# Altium schematic symbol library jlcpcb_2025_04_capacitors_extended_0805.schlib: 3281 symbols (part 7 of 18) (continued)
## C2012X7R2E222KT020U
designator C?  Capacitance: 2.2nF  (hidden comment: *)
Capacitor, Ceramic (MLCC), 2.2nF, ±10%, 250V, X7R, ±10%, SMD 0805; Manufacturer: TDK; Manufacturer Part Number: C2012X7R2E222KT020U; Package Size: 0805; JLCPCB Basic Part: No; JLCPCB Part Number: C343005; Supplier 1: LCSC; Category: Capacitors - MLCC; Supplier Part Number 1: C343005; Tolerance: ±10%; Voltage Rating: 250V; Temperature Coefficient: X7R; RoHS: Yes; ComponentLink1Description: Datasheet; ComponentLink1URL: https://wmsc.lcsc.com/wmsc/upload/file/pdf/v2/lcsc/2304140030_TDK-C2012X7R2E222KT020U_C343005.pdf; ComponentLink2Description: JLCPCB Part URL; ComponentLink2URL: https://jlcpcb.com/partdetail/C343005; ComponentLink3Description: LCSC Part URL; ComponentLink3URL: https://lcsc.com/product-detail/Multilayer-Ceramic-Capacitors-MLCC---SMD-SMT_TDK-TDK-C2012X7R2E222KT020U_C343005.html
footprint CAP-0805 (0805 (2012M) Capacitor)
pins: 1, 2

## C2012X7R2E223KT0L0U
designator C?  Capacitance: 22nF  (hidden comment: *)
Capacitor, Ceramic (MLCC), 22nF, ±10%, 250V, X7R, ±10%, SMD 0805; Manufacturer: TDK; Manufacturer Part Number: C2012X7R2E223KT0L0U; Package Size: 0805; JLCPCB Basic Part: No; JLCPCB Part Number: C342474; Supplier 1: LCSC; Category: Capacitors - MLCC; Supplier Part Number 1: C342474; Tolerance: ±10%; Voltage Rating: 250V; Temperature Coefficient: X7R; RoHS: Yes; ComponentLink1Description: Datasheet; ComponentLink1URL: https://wmsc.lcsc.com/wmsc/upload/file/pdf/v2/lcsc/2304140030_TDK-C2012X7R2E223KT0L0U_C342474.pdf; ComponentLink2Description: JLCPCB Part URL; ComponentLink2URL: https://jlcpcb.com/partdetail/C342474; ComponentLink3Description: LCSC Part URL; ComponentLink3URL: https://lcsc.com/product-detail/Multilayer-Ceramic-Capacitors-MLCC---SMD-SMT_TDK-TDK-C2012X7R2E223KT0L0U_C342474.html
footprint CAP-0805 (0805 (2012M) Capacitor)
pins: 1, 2

## C2012X7R102KGTS
designator C?  Capacitance: 1nF  (hidden comment: *)
Capacitor, Ceramic (MLCC), 1nF, ±10%, 50V, X7R, ±10%, SMD 0805; Manufacturer: Darfon Elec; Manufacturer Part Number: C2012X7R102KGTS; Package Size: 0805; JLCPCB Basic Part: No; JLCPCB Part Number: C722241; Supplier 1: LCSC; Category: Capacitors - MLCC; Supplier Part Number 1: C722241; Tolerance: ±10%; Voltage Rating: 50V; Temperature Coefficient: X7R; RoHS: Yes; ComponentLink1Description: Datasheet; ComponentLink1URL: https://wmsc.lcsc.com/wmsc/upload/file/pdf/v2/lcsc/2008181235_Darfon-Elec-C2012X7R102KGTS_C722241.pdf; ComponentLink2Description: JLCPCB Part URL; ComponentLink2URL: https://jlcpcb.com/partdetail/C722241; ComponentLink3Description: LCSC Part URL; ComponentLink3URL: https://lcsc.com/product-detail/Multilayer-Ceramic-Capacitors-MLCC---SMD-SMT_Darfon-Elec-Darfon-Elec-C2012X7R102KGTS_C722241.html
footprint CAP-0805 (0805 (2012M) Capacitor)
pins: 1, 2

## C2012X7R103KGTS
designator C?  Capacitance: 10nF  (hidden comment: *)
Capacitor, Ceramic (MLCC), 10nF, ±10%, 50V, X7R, ±10%, SMD 0805; Manufacturer: Darfon Elec; Manufacturer Part Number: C2012X7R103KGTS; Package Size: 0805; JLCPCB Basic Part: No; JLCPCB Part Number: C722238; Supplier 1: LCSC; Category: Capacitors - MLCC; Supplier Part Number 1: C722238; Tolerance: ±10%; Voltage Rating: 50V; Temperature Coefficient: X7R; RoHS: Yes; ComponentLink1Description: Datasheet; ComponentLink1URL: https://wmsc.lcsc.com/wmsc/upload/file/pdf/v2/lcsc/2304140030_Darfon-Elec-C2012X7R103KGTS_C722238.pdf; ComponentLink2Description: JLCPCB Part URL; ComponentLink2URL: https://jlcpcb.com/partdetail/C722238; ComponentLink3Description: LCSC Part URL; ComponentLink3URL: https://lcsc.com/product-detail/Multilayer-Ceramic-Capacitors-MLCC---SMD-SMT_Darfon-Elec-Darfon-Elec-C2012X7R103KGTS_C722238.html
footprint CAP-0805 (0805 (2012M) Capacitor)
pins: 1, 2

## C2012X7R153KHTS
designator C?  Capacitance: 15nF  (hidden comment: *)
Capacitor, Ceramic (MLCC), 15nF, ±10%, 100V, X7R, ±10%, SMD 0805; Manufacturer: Darfon Elec; Manufacturer Part Number: C2012X7R153KHTS; Package Size: 0805; JLCPCB Basic Part: No; JLCPCB Part Number: C725585; Supplier 1: LCSC; Category: Capacitors - MLCC; Supplier Part Number 1: C725585; Tolerance: ±10%; Voltage Rating: 100V; Temperature Coefficient: X7R; RoHS: Yes; ComponentLink1Description: Datasheet; ComponentLink1URL: https://wmsc.lcsc.com/wmsc/upload/file/pdf/v2/lcsc/2304140030_Darfon-Elec-C2012X7R153KHTS_C725585.pdf; ComponentLink2Description: JLCPCB Part URL; ComponentLink2URL: https://jlcpcb.com/partdetail/C725585; ComponentLink3Description: LCSC Part URL; ComponentLink3URL: https://lcsc.com/product-detail/Multilayer-Ceramic-Capacitors-MLCC---SMD-SMT_Darfon-Elec-Darfon-Elec-C2012X7R153KHTS_C725585.html
footprint CAP-0805 (0805 (2012M) Capacitor)
pins: 1, 2

## C2012X7R224KGTS
designator C?  Capacitance: 220nF  (hidden comment: *)
Capacitor, Ceramic (MLCC), 220nF, ±10%, 50V, X7R, ±10%, SMD 0805; Manufacturer: Darfon Elec; Manufacturer Part Number: C2012X7R224KGTS; Package Size: 0805; JLCPCB Basic Part: No; JLCPCB Part Number: C725579; Supplier 1: LCSC; Category: Capacitors - MLCC; Supplier Part Number 1: C725579; Tolerance: ±10%; Voltage Rating: 50V; Temperature Coefficient: X7R; RoHS: Yes; ComponentLink1Description: Datasheet; ComponentLink1URL: https://wmsc.lcsc.com/wmsc/upload/file/pdf/v2/lcsc/2304140030_Darfon-Elec-C2012X7R224KGTS_C725579.pdf; ComponentLink2Description: JLCPCB Part URL; ComponentLink2URL: https://jlcpcb.com/partdetail/C725579; ComponentLink3Description: LCSC Part URL; ComponentLink3URL: https://lcsc.com/product-detail/Multilayer-Ceramic-Capacitors-MLCC---SMD-SMT_Darfon-Elec-Darfon-Elec-C2012X7R224KGTS_C725579.html
footprint CAP-0805 (0805 (2012M) Capacitor)
pins: 1, 2

## C2012X7R471KKTS
designator C?  Capacitance: 470pF  (hidden comment: *)
Capacitor, Ceramic (MLCC), 470pF, ±10%, 250V, X7R, ±10%, SMD 0805; Manufacturer: Darfon Elec; Manufacturer Part Number: C2012X7R471KKTS; Package Size: 0805; JLCPCB Basic Part: No; JLCPCB Part Number: C725588; Supplier 1: LCSC; Category: Capacitors - MLCC; Supplier Part Number 1: C725588; Tolerance: ±10%; Voltage Rating: 250V; Temperature Coefficient: X7R; RoHS: Yes; ComponentLink1Description: Datasheet; ComponentLink1URL: https://wmsc.lcsc.com/wmsc/upload/file/pdf/v2/lcsc/2304140030_Darfon-Elec-C2012X7R471KKTS_C725588.pdf; ComponentLink2Description: JLCPCB Part URL; ComponentLink2URL: https://jlcpcb.com/partdetail/C725588; ComponentLink3Description: LCSC Part URL; ComponentLink3URL: https://lcsc.com/product-detail/Multilayer-Ceramic-Capacitors-MLCC---SMD-SMT_Darfon-Elec-Darfon-Elec-C2012X7R471KKTS_C725588.html
footprint CAP-0805 (0805 (2012M) Capacitor)
pins: 1, 2

## C2012X7S0J226MT000E
designator C?  Capacitance: 22uF  (hidden comment: *)
Capacitor, Ceramic (MLCC), 22uF, ±20%, 6.3V, X7S, ±20%, SMD 0805; Manufacturer: TDK; Manufacturer Part Number: C2012X7S0J226MT000E; Package Size: 0805; JLCPCB Basic Part: No; JLCPCB Part Number: C342680; Supplier 1: LCSC; Category: Capacitors - MLCC; Supplier Part Number 1: C342680; Tolerance: ±20%; Voltage Rating: 6.3V; Temperature Coefficient: X7S; RoHS: Yes; ComponentLink1Description: Datasheet; ComponentLink1URL: https://wmsc.lcsc.com/wmsc/upload/file/pdf/v2/lcsc/2304140030_TDK-C2012X7S0J226MT000E_C342680.pdf; ComponentLink2Description: JLCPCB Part URL; ComponentLink2URL: https://jlcpcb.com/partdetail/C342680; ComponentLink3Description: LCSC Part URL; ComponentLink3URL: https://lcsc.com/product-detail/Multilayer-Ceramic-Capacitors-MLCC---SMD-SMT_TDK-TDK-C2012X7S0J226MT000E_C342680.html
footprint CAP-0805 (0805 (2012M) Capacitor)
pins: 1, 2

## C2012X7S1A226MT000E
designator C?  Capacitance: 22uF  (hidden comment: *)
Capacitor, Ceramic (MLCC), 22uF, ±20%, 10V, X7S, ±20%, SMD 0805; Manufacturer: TDK; Manufacturer Part Number: C2012X7S1A226MT000E; Package Size: 0805; JLCPCB Basic Part: No; JLCPCB Part Number: C342717; Supplier 1: LCSC; Category: Capacitors - MLCC; Supplier Part Number 1: C342717; Tolerance: ±20%; Voltage Rating: 10V; Temperature Coefficient: X7S; RoHS: Yes; ComponentLink1Description: Datasheet; ComponentLink1URL: https://wmsc.lcsc.com/wmsc/upload/file/pdf/v2/lcsc/2304140030_TDK-C2012X7S1A226MT000E_C342717.pdf; ComponentLink2Description: JLCPCB Part URL; ComponentLink2URL: https://jlcpcb.com/partdetail/C342717; ComponentLink3Description: LCSC Part URL; ComponentLink3URL: https://lcsc.com/product-detail/Multilayer-Ceramic-Capacitors-MLCC---SMD-SMT_TDK-TDK-C2012X7S1A226MT000E_C342717.html
footprint CAP-0805 (0805 (2012M) Capacitor)
pins: 1, 2

## C2012X7S1E106K125AE
designator C?  Capacitance: 10uF  (hidden comment: *)
Capacitor, Ceramic (MLCC), 10uF, 25V, X7S, SMD 0805; Manufacturer: TDK; Manufacturer Part Number: C2012X7S1E106K125AE; Package Size: 0805; JLCPCB Basic Part: No; JLCPCB Part Number: C3901911; Supplier 1: LCSC; Category: Capacitors - MLCC; Supplier Part Number 1: C3901911; Voltage Rating: 25V; Temperature Coefficient: X7S; RoHS: Yes; ComponentLink1Description: Datasheet; ComponentLink1URL: https://wmsc.lcsc.com/wmsc/upload/file/pdf/v2/lcsc/2401221636_TDK-C2012X7S1E106K125AE_C3901911.pdf; ComponentLink2Description: JLCPCB Part URL; ComponentLink2URL: https://jlcpcb.com/partdetail/C3901911; ComponentLink3Description: LCSC Part URL; ComponentLink3URL: https://lcsc.com/product-detail/Multilayer-Ceramic-Capacitors-MLCC---SMD-SMT_TDK-TDK-C2012X7S1E106K125AE_C3901911.html
footprint CAP-0805 (0805 (2012M) Capacitor)
pins: 1, 2

## C2012X7S1E106KT0A0E
designator C?  Capacitance: 10uF  (hidden comment: *)
Capacitor, Ceramic (MLCC), 10uF, ±10%, 25V, ±10%, SMD 0805; Manufacturer: TDK; Manufacturer Part Number: C2012X7S1E106KT0A0E; Package Size: 0805; JLCPCB Basic Part: No; JLCPCB Part Number: C694191; Supplier 1: LCSC; Category: Capacitors - MLCC; Supplier Part Number 1: C694191; Tolerance: ±10%; Voltage Rating: 25V; RoHS: Yes; ComponentLink1Description: Datasheet; ComponentLink1URL: https://wmsc.lcsc.com/wmsc/upload/file/pdf/v2/lcsc/2304140030_TDK-C2012X7S1E106KT0A0E_C694191.pdf; ComponentLink2Description: JLCPCB Part URL; ComponentLink2URL: https://jlcpcb.com/partdetail/C694191; ComponentLink3Description: LCSC Part URL; ComponentLink3URL: https://lcsc.com/product-detail/Multilayer-Ceramic-Capacitors-MLCC---SMD-SMT_TDK-TDK-C2012X7S1E106KT0A0E_C694191.html
footprint CAP-0805 (0805 (2012M) Capacitor)
pins: 1, 2

## C2012X7S2A105KT000N
designator C?  Capacitance: 1uF  (hidden comment: *)
Capacitor, Ceramic (MLCC), 1uF, ±10%, 100V, X7S, ±10%, SMD 0805; Manufacturer: TDK; Manufacturer Part Number: C2012X7S2A105KT000N; Package Size: 0805; JLCPCB Basic Part: No; JLCPCB Part Number: C342785; Supplier 1: LCSC; Category: Capacitors - MLCC; Supplier Part Number 1: C342785; Tolerance: ±10%; Voltage Rating: 100V; Temperature Coefficient: X7S; RoHS: Yes; ComponentLink1Description: Datasheet; ComponentLink1URL: https://wmsc.lcsc.com/wmsc/upload/file/pdf/v2/lcsc/2304140030_TDK-C2012X7S2A105KT000N_C342785.pdf; ComponentLink2Description: JLCPCB Part URL; ComponentLink2URL: https://jlcpcb.com/partdetail/C342785; ComponentLink3Description: LCSC Part URL; ComponentLink3URL: https://lcsc.com/product-detail/Multilayer-Ceramic-Capacitors-MLCC---SMD-SMT_TDK-TDK-C2012X7S2A105KT000N_C342785.html
footprint CAP-0805 (0805 (2012M) Capacitor)
pins: 1, 2

## C2012X7S2A224KT000N
designator C?  Capacitance: 220nF  (hidden comment: *)
Capacitor, Ceramic (MLCC), 220nF, ±10%, 100V, X7S, ±10%, SMD 0805; Manufacturer: TDK; Manufacturer Part Number: C2012X7S2A224KT000N; Package Size: 0805; JLCPCB Basic Part: No; JLCPCB Part Number: C342873; Supplier 1: LCSC; Category: Capacitors - MLCC; Supplier Part Number 1: C342873; Tolerance: ±10%; Voltage Rating: 100V; Temperature Coefficient: X7S; RoHS: Yes; ComponentLink1Description: Datasheet; ComponentLink1URL: https://wmsc.lcsc.com/wmsc/upload/file/pdf/v2/lcsc/2304140030_TDK-C2012X7S2A224KT000N_C342873.pdf; ComponentLink2Description: JLCPCB Part URL; ComponentLink2URL: https://jlcpcb.com/partdetail/C342873; ComponentLink3Description: LCSC Part URL; ComponentLink3URL: https://lcsc.com/product-detail/Multilayer-Ceramic-Capacitors-MLCC---SMD-SMT_TDK-TDK-C2012X7S2A224KT000N_C342873.html
footprint CAP-0805 (0805 (2012M) Capacitor)
pins: 1, 2

## C2012X7S2A474KT000N
designator C?  Capacitance: 470nF  (hidden comment: *)
Capacitor, Ceramic (MLCC), 470nF, ±10%, 100V, X7S, ±10%, SMD 0805; Manufacturer: TDK; Manufacturer Part Number: C2012X7S2A474KT000N; Package Size: 0805; JLCPCB Basic Part: No; JLCPCB Part Number: C342818; Supplier 1: LCSC; Category: Capacitors - MLCC; Supplier Part Number 1: C342818; Tolerance: ±10%; Voltage Rating: 100V; Temperature Coefficient: X7S; RoHS: Yes; ComponentLink1Description: Datasheet; ComponentLink1URL: https://wmsc.lcsc.com/wmsc/upload/file/pdf/v2/lcsc/2304140030_TDK-C2012X7S2A474KT000N_C342818.pdf; ComponentLink2Description: JLCPCB Part URL; ComponentLink2URL: https://jlcpcb.com/partdetail/C342818; ComponentLink3Description: LCSC Part URL; ComponentLink3URL: https://lcsc.com/product-detail/Multilayer-Ceramic-Capacitors-MLCC---SMD-SMT_TDK-TDK-C2012X7S2A474KT000N_C342818.html
footprint CAP-0805 (0805 (2012M) Capacitor)
pins: 1, 2

## C2012X7T2E104KT000N
designator C?  Capacitance: 100nF  (hidden comment: *)
Capacitor, Ceramic (MLCC), 100nF, ±10%, 250V, X7T, ±10%, SMD 0805; Manufacturer: TDK; Manufacturer Part Number: C2012X7T2E104KT000N; Package Size: 0805; JLCPCB Basic Part: No; JLCPCB Part Number: C342865; Supplier 1: LCSC; Category: Capacitors - MLCC; Supplier Part Number 1: C342865; Tolerance: ±10%; Voltage Rating: 250V; Temperature Coefficient: X7T; RoHS: Yes; ComponentLink1Description: Datasheet; ComponentLink1URL: https://wmsc.lcsc.com/wmsc/upload/file/pdf/v2/lcsc/2304140030_TDK-C2012X7T2E104KT000N_C342865.pdf; ComponentLink2Description: JLCPCB Part URL; ComponentLink2URL: https://jlcpcb.com/partdetail/C342865; ComponentLink3Description: LCSC Part URL; ComponentLink3URL: https://lcsc.com/product-detail/Multilayer-Ceramic-Capacitors-MLCC---SMD-SMT_TDK-TDK-C2012X7T2E104KT000N_C342865.html
footprint CAP-0805 (0805 (2012M) Capacitor)
pins: 1, 2

## C2012X7T2E473KT000N
designator C?  Capacitance: 47nF  (hidden comment: *)
Capacitor, Ceramic (MLCC), 47nF, ±10%, 250V, X7T, ±10%, SMD 0805; Manufacturer: TDK; Manufacturer Part Number: C2012X7T2E473KT000N; Package Size: 0805; JLCPCB Basic Part: No; JLCPCB Part Number: C338058; Supplier 1: LCSC; Category: Capacitors - MLCC; Supplier Part Number 1: C338058; Tolerance: ±10%; Voltage Rating: 250V; Temperature Coefficient: X7T; RoHS: Yes; ComponentLink1Description: Datasheet; ComponentLink1URL: https://wmsc.lcsc.com/wmsc/upload/file/pdf/v2/lcsc/2304140030_TDK-C2012X7T2E473KT000N_C338058.pdf; ComponentLink2Description: JLCPCB Part URL; ComponentLink2URL: https://jlcpcb.com/partdetail/C338058; ComponentLink3Description: LCSC Part URL; ComponentLink3URL: https://lcsc.com/product-detail/Multilayer-Ceramic-Capacitors-MLCC---SMD-SMT_TDK-TDK-C2012X7T2E473KT000N_C338058.html
footprint CAP-0805 (0805 (2012M) Capacitor)
pins: 1, 2

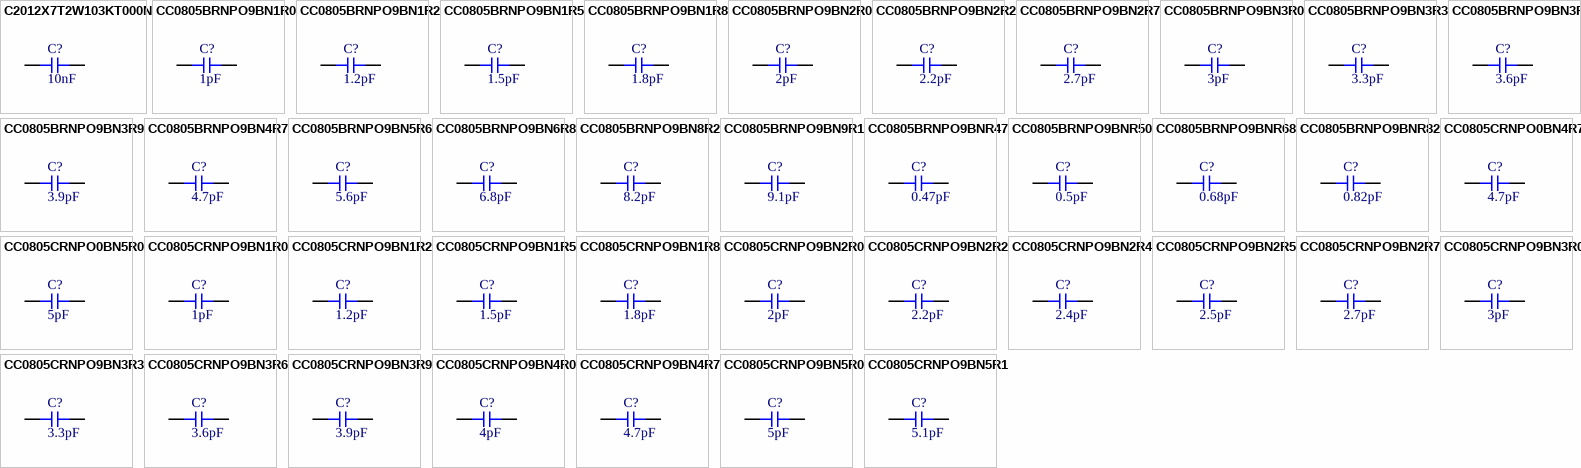
[diagram p30: symbols C2012X7T2W103KT000N to CC0805CRNPO9BN5R1]

## C2012X7T2W103KT000N
designator C?  Capacitance: 10nF  (hidden comment: *)
Capacitor, Ceramic (MLCC), 10nF, ±10%, 450V, X7T, ±10%, SMD 0805; Manufacturer: TDK; Manufacturer Part Number: C2012X7T2W103KT000N; Package Size: 0805; JLCPCB Basic Part: No; JLCPCB Part Number: C342860; Supplier 1: LCSC; Category: Capacitors - MLCC; Supplier Part Number 1: C342860; Tolerance: ±10%; Voltage Rating: 450V; Temperature Coefficient: X7T; RoHS: Yes; ComponentLink1Description: Datasheet; ComponentLink1URL: https://wmsc.lcsc.com/wmsc/upload/file/pdf/v2/lcsc/2304140030_TDK-C2012X7T2W103KT000N_C342860.pdf; ComponentLink2Description: JLCPCB Part URL; ComponentLink2URL: https://jlcpcb.com/partdetail/C342860; ComponentLink3Description: LCSC Part URL; ComponentLink3URL: https://lcsc.com/product-detail/Multilayer-Ceramic-Capacitors-MLCC---SMD-SMT_TDK-TDK-C2012X7T2W103KT000N_C342860.html
footprint CAP-0805 (0805 (2012M) Capacitor)
pins: 1, 2

## CC0805BRNPO9BN1R0
designator C?  Capacitance: 1pF  (hidden comment: *)
Capacitor, Ceramic (MLCC), 1pF, 50V, NP0, SMD 0805; Manufacturer: YAGEO; Manufacturer Part Number: CC0805BRNPO9BN1R0; Package Size: 0805; JLCPCB Basic Part: No; JLCPCB Part Number: C519982; Supplier 1: LCSC; Category: Capacitors - MLCC; Supplier Part Number 1: C519982; Voltage Rating: 50V; Temperature Coefficient: NP0; RoHS: Yes; ComponentLink1Description: Datasheet; ComponentLink1URL: https://wmsc.lcsc.com/wmsc/upload/file/pdf/v2/lcsc/2005141203_YAGEO-CC0805BRNPO9BN1R0_C519982.pdf; ComponentLink2Description: JLCPCB Part URL; ComponentLink2URL: https://jlcpcb.com/partdetail/C519982; ComponentLink3Description: LCSC Part URL; ComponentLink3URL: https://lcsc.com/product-detail/Multilayer-Ceramic-Capacitors-MLCC---SMD-SMT_YAGEO-YAGEO-CC0805BRNPO9BN1R0_C519982.html
footprint CAP-0805 (0805 (2012M) Capacitor)
pins: 1, 2

## CC0805BRNPO9BN1R2
designator C?  Capacitance: 1.2pF  (hidden comment: *)
Capacitor, Ceramic (MLCC), 1.2pF, 50V, NP0, SMD 0805; Manufacturer: YAGEO; Manufacturer Part Number: CC0805BRNPO9BN1R2; Package Size: 0805; JLCPCB Basic Part: No; JLCPCB Part Number: C519983; Supplier 1: LCSC; Category: Capacitors - MLCC; Supplier Part Number 1: C519983; Voltage Rating: 50V; Temperature Coefficient: NP0; RoHS: Yes; ComponentLink1Description: Datasheet; ComponentLink1URL: https://wmsc.lcsc.com/wmsc/upload/file/pdf/v2/lcsc/2008122133_YAGEO-CC0805BRNPO9BN1R2_C519983.pdf; ComponentLink2Description: JLCPCB Part URL; ComponentLink2URL: https://jlcpcb.com/partdetail/C519983; ComponentLink3Description: LCSC Part URL; ComponentLink3URL: https://lcsc.com/product-detail/Multilayer-Ceramic-Capacitors-MLCC---SMD-SMT_YAGEO-YAGEO-CC0805BRNPO9BN1R2_C519983.html
footprint CAP-0805 (0805 (2012M) Capacitor)
pins: 1, 2

## CC0805BRNPO9BN1R5
designator C?  Capacitance: 1.5pF  (hidden comment: *)
Capacitor, Ceramic (MLCC), 1.5pF, 50V, NP0, SMD 0805; Manufacturer: YAGEO; Manufacturer Part Number: CC0805BRNPO9BN1R5; Package Size: 0805; JLCPCB Basic Part: No; JLCPCB Part Number: C519984; Supplier 1: LCSC; Category: Capacitors - MLCC; Supplier Part Number 1: C519984; Voltage Rating: 50V; Temperature Coefficient: NP0; RoHS: Yes; ComponentLink1Description: Datasheet; ComponentLink1URL: https://wmsc.lcsc.com/wmsc/upload/file/pdf/v2/lcsc/2007161235_YAGEO-CC0805BRNPO9BN1R5_C519984.pdf; ComponentLink2Description: JLCPCB Part URL; ComponentLink2URL: https://jlcpcb.com/partdetail/C519984; ComponentLink3Description: LCSC Part URL; ComponentLink3URL: https://lcsc.com/product-detail/Multilayer-Ceramic-Capacitors-MLCC---SMD-SMT_YAGEO-YAGEO-CC0805BRNPO9BN1R5_C519984.html
footprint CAP-0805 (0805 (2012M) Capacitor)
pins: 1, 2

## CC0805BRNPO9BN1R8
designator C?  Capacitance: 1.8pF  (hidden comment: *)
Capacitor, Ceramic (MLCC), 1.8pF, 50V, NP0, SMD 0805; Manufacturer: YAGEO; Manufacturer Part Number: CC0805BRNPO9BN1R8; Package Size: 0805; JLCPCB Basic Part: No; JLCPCB Part Number: C519985; Supplier 1: LCSC; Category: Capacitors - MLCC; Supplier Part Number 1: C519985; Voltage Rating: 50V; Temperature Coefficient: NP0; RoHS: Yes; ComponentLink1Description: Datasheet; ComponentLink1URL: https://wmsc.lcsc.com/wmsc/upload/file/pdf/v2/lcsc/2007161235_YAGEO-CC0805BRNPO9BN1R8_C519985.pdf; ComponentLink2Description: JLCPCB Part URL; ComponentLink2URL: https://jlcpcb.com/partdetail/C519985; ComponentLink3Description: LCSC Part URL; ComponentLink3URL: https://lcsc.com/product-detail/Multilayer-Ceramic-Capacitors-MLCC---SMD-SMT_YAGEO-YAGEO-CC0805BRNPO9BN1R8_C519985.html
footprint CAP-0805 (0805 (2012M) Capacitor)
pins: 1, 2

## CC0805BRNPO9BN2R0
designator C?  Capacitance: 2pF  (hidden comment: *)
Capacitor, Ceramic (MLCC), 2pF, 50V, NP0, SMD 0805; Manufacturer: YAGEO; Manufacturer Part Number: CC0805BRNPO9BN2R0; Package Size: 0805; JLCPCB Basic Part: No; JLCPCB Part Number: C519986; Supplier 1: LCSC; Category: Capacitors - MLCC; Supplier Part Number 1: C519986; Voltage Rating: 50V; Temperature Coefficient: NP0; RoHS: Yes; ComponentLink1Description: Datasheet; ComponentLink1URL: https://wmsc.lcsc.com/wmsc/upload/file/pdf/v2/lcsc/2006011836_YAGEO-CC0805BRNPO9BN2R0_C519986.pdf; ComponentLink2Description: JLCPCB Part URL; ComponentLink2URL: https://jlcpcb.com/partdetail/C519986; ComponentLink3Description: LCSC Part URL; ComponentLink3URL: https://lcsc.com/product-detail/Multilayer-Ceramic-Capacitors-MLCC---SMD-SMT_YAGEO-YAGEO-CC0805BRNPO9BN2R0_C519986.html
footprint CAP-0805 (0805 (2012M) Capacitor)
pins: 1, 2

## CC0805BRNPO9BN2R2
designator C?  Capacitance: 2.2pF  (hidden comment: *)
Capacitor, Ceramic (MLCC), 2.2pF, 50V, NP0, SMD 0805; Manufacturer: YAGEO; Manufacturer Part Number: CC0805BRNPO9BN2R2; Package Size: 0805; JLCPCB Basic Part: No; JLCPCB Part Number: C519987; Supplier 1: LCSC; Category: Capacitors - MLCC; Supplier Part Number 1: C519987; Voltage Rating: 50V; Temperature Coefficient: NP0; RoHS: Yes; ComponentLink1Description: Datasheet; ComponentLink1URL: https://wmsc.lcsc.com/wmsc/upload/file/pdf/v2/lcsc/2006011836_YAGEO-CC0805BRNPO9BN2R2_C519987.pdf; ComponentLink2Description: JLCPCB Part URL; ComponentLink2URL: https://jlcpcb.com/partdetail/C519987; ComponentLink3Description: LCSC Part URL; ComponentLink3URL: https://lcsc.com/product-detail/Multilayer-Ceramic-Capacitors-MLCC---SMD-SMT_YAGEO-YAGEO-CC0805BRNPO9BN2R2_C519987.html
footprint CAP-0805 (0805 (2012M) Capacitor)
pins: 1, 2

## CC0805BRNPO9BN2R7
designator C?  Capacitance: 2.7pF  (hidden comment: *)
Capacitor, Ceramic (MLCC), 2.7pF, 50V, NP0, SMD 0805; Manufacturer: YAGEO; Manufacturer Part Number: CC0805BRNPO9BN2R7; Package Size: 0805; JLCPCB Basic Part: No; JLCPCB Part Number: C519988; Supplier 1: LCSC; Category: Capacitors - MLCC; Supplier Part Number 1: C519988; Voltage Rating: 50V; Temperature Coefficient: NP0; RoHS: Yes; ComponentLink1Description: Datasheet; ComponentLink1URL: https://wmsc.lcsc.com/wmsc/upload/file/pdf/v2/lcsc/2007161235_YAGEO-CC0805BRNPO9BN2R7_C519988.pdf; ComponentLink2Description: JLCPCB Part URL; ComponentLink2URL: https://jlcpcb.com/partdetail/C519988; ComponentLink3Description: LCSC Part URL; ComponentLink3URL: https://lcsc.com/product-detail/Multilayer-Ceramic-Capacitors-MLCC---SMD-SMT_YAGEO-YAGEO-CC0805BRNPO9BN2R7_C519988.html
footprint CAP-0805 (0805 (2012M) Capacitor)
pins: 1, 2

## CC0805BRNPO9BN3R0
designator C?  Capacitance: 3pF  (hidden comment: *)
Capacitor, Ceramic (MLCC), 3pF, 50V, NP0, SMD 0805; Manufacturer: YAGEO; Manufacturer Part Number: CC0805BRNPO9BN3R0; Package Size: 0805; JLCPCB Basic Part: No; JLCPCB Part Number: C519989; Supplier 1: LCSC; Category: Capacitors - MLCC; Supplier Part Number 1: C519989; Voltage Rating: 50V; Temperature Coefficient: NP0; RoHS: Yes; ComponentLink1Description: Datasheet; ComponentLink1URL: https://wmsc.lcsc.com/wmsc/upload/file/pdf/v2/lcsc/2007161235_YAGEO-CC0805BRNPO9BN3R0_C519989.pdf; ComponentLink2Description: JLCPCB Part URL; ComponentLink2URL: https://jlcpcb.com/partdetail/C519989; ComponentLink3Description: LCSC Part URL; ComponentLink3URL: https://lcsc.com/product-detail/Multilayer-Ceramic-Capacitors-MLCC---SMD-SMT_YAGEO-YAGEO-CC0805BRNPO9BN3R0_C519989.html
footprint CAP-0805 (0805 (2012M) Capacitor)
pins: 1, 2

## CC0805BRNPO9BN3R3
designator C?  Capacitance: 3.3pF  (hidden comment: *)
Capacitor, Ceramic (MLCC), 3.3pF, 50V, NP0, SMD 0805; Manufacturer: YAGEO; Manufacturer Part Number: CC0805BRNPO9BN3R3; Package Size: 0805; JLCPCB Basic Part: No; JLCPCB Part Number: C519990; Supplier 1: LCSC; Category: Capacitors - MLCC; Supplier Part Number 1: C519990; Voltage Rating: 50V; Temperature Coefficient: NP0; RoHS: Yes; ComponentLink1Description: Datasheet; ComponentLink1URL: https://wmsc.lcsc.com/wmsc/upload/file/pdf/v2/lcsc/2007231534_YAGEO-CC0805BRNPO9BN3R3_C519990.pdf; ComponentLink2Description: JLCPCB Part URL; ComponentLink2URL: https://jlcpcb.com/partdetail/C519990; ComponentLink3Description: LCSC Part URL; ComponentLink3URL: https://lcsc.com/product-detail/Multilayer-Ceramic-Capacitors-MLCC---SMD-SMT_YAGEO-YAGEO-CC0805BRNPO9BN3R3_C519990.html
footprint CAP-0805 (0805 (2012M) Capacitor)
pins: 1, 2

## CC0805BRNPO9BN3R6
designator C?  Capacitance: 3.6pF  (hidden comment: *)
Capacitor, Ceramic (MLCC), 3.6pF, 50V, NP0, SMD 0805; Manufacturer: YAGEO; Manufacturer Part Number: CC0805BRNPO9BN3R6; Package Size: 0805; JLCPCB Basic Part: No; JLCPCB Part Number: C519991; Supplier 1: LCSC; Category: Capacitors - MLCC; Supplier Part Number 1: C519991; Voltage Rating: 50V; Temperature Coefficient: NP0; RoHS: Yes; ComponentLink1Description: Datasheet; ComponentLink1URL: https://wmsc.lcsc.com/wmsc/upload/file/pdf/v2/lcsc/2012162139_YAGEO-CC0805BRNPO9BN3R6_C519991.pdf; ComponentLink2Description: JLCPCB Part URL; ComponentLink2URL: https://jlcpcb.com/partdetail/C519991; ComponentLink3Description: LCSC Part URL; ComponentLink3URL: https://lcsc.com/product-detail/Multilayer-Ceramic-Capacitors-MLCC---SMD-SMT_YAGEO-YAGEO-CC0805BRNPO9BN3R6_C519991.html
footprint CAP-0805 (0805 (2012M) Capacitor)
pins: 1, 2

## CC0805BRNPO9BN3R9
designator C?  Capacitance: 3.9pF  (hidden comment: *)
Capacitor, Ceramic (MLCC), 3.9pF, 50V, NP0, SMD 0805; Manufacturer: YAGEO; Manufacturer Part Number: CC0805BRNPO9BN3R9; Package Size: 0805; JLCPCB Basic Part: No; JLCPCB Part Number: C519992; Supplier 1: LCSC; Category: Capacitors - MLCC; Supplier Part Number 1: C519992; Voltage Rating: 50V; Temperature Coefficient: NP0; RoHS: Yes; ComponentLink1Description: Datasheet; ComponentLink1URL: https://wmsc.lcsc.com/wmsc/upload/file/pdf/v2/lcsc/2007231534_YAGEO-CC0805BRNPO9BN3R9_C519992.pdf; ComponentLink2Description: JLCPCB Part URL; ComponentLink2URL: https://jlcpcb.com/partdetail/C519992; ComponentLink3Description: LCSC Part URL; ComponentLink3URL: https://lcsc.com/product-detail/Multilayer-Ceramic-Capacitors-MLCC---SMD-SMT_YAGEO-YAGEO-CC0805BRNPO9BN3R9_C519992.html
footprint CAP-0805 (0805 (2012M) Capacitor)
pins: 1, 2

## CC0805BRNPO9BN4R7
designator C?  Capacitance: 4.7pF  (hidden comment: *)
Capacitor, Ceramic (MLCC), 4.7pF, 50V, NP0, SMD 0805; Manufacturer: YAGEO; Manufacturer Part Number: CC0805BRNPO9BN4R7; Package Size: 0805; JLCPCB Basic Part: No; JLCPCB Part Number: C519993; Supplier 1: LCSC; Category: Capacitors - MLCC; Supplier Part Number 1: C519993; Voltage Rating: 50V; Temperature Coefficient: NP0; RoHS: Yes; ComponentLink1Description: Datasheet; ComponentLink1URL: https://wmsc.lcsc.com/wmsc/upload/file/pdf/v2/lcsc/2006011836_YAGEO-CC0805BRNPO9BN4R7_C519993.pdf; ComponentLink2Description: JLCPCB Part URL; ComponentLink2URL: https://jlcpcb.com/partdetail/C519993; ComponentLink3Description: LCSC Part URL; ComponentLink3URL: https://lcsc.com/product-detail/Multilayer-Ceramic-Capacitors-MLCC---SMD-SMT_YAGEO-YAGEO-CC0805BRNPO9BN4R7_C519993.html
footprint CAP-0805 (0805 (2012M) Capacitor)
pins: 1, 2

## CC0805BRNPO9BN5R6
designator C?  Capacitance: 5.6pF  (hidden comment: *)
Capacitor, Ceramic (MLCC), 5.6pF, 50V, NP0, SMD 0805; Manufacturer: YAGEO; Manufacturer Part Number: CC0805BRNPO9BN5R6; Package Size: 0805; JLCPCB Basic Part: No; JLCPCB Part Number: C519994; Supplier 1: LCSC; Category: Capacitors - MLCC; Supplier Part Number 1: C519994; Voltage Rating: 50V; Temperature Coefficient: NP0; RoHS: Yes; ComponentLink1Description: Datasheet; ComponentLink1URL: https://wmsc.lcsc.com/wmsc/upload/file/pdf/v2/lcsc/2008031233_YAGEO-CC0805BRNPO9BN5R6_C519994.pdf; ComponentLink2Description: JLCPCB Part URL; ComponentLink2URL: https://jlcpcb.com/partdetail/C519994; ComponentLink3Description: LCSC Part URL; ComponentLink3URL: https://lcsc.com/product-detail/Multilayer-Ceramic-Capacitors-MLCC---SMD-SMT_YAGEO-YAGEO-CC0805BRNPO9BN5R6_C519994.html
footprint CAP-0805 (0805 (2012M) Capacitor)
pins: 1, 2

## CC0805BRNPO9BN6R8
designator C?  Capacitance: 6.8pF  (hidden comment: *)
Capacitor, Ceramic (MLCC), 6.8pF, 50V, NP0, SMD 0805; Manufacturer: YAGEO; Manufacturer Part Number: CC0805BRNPO9BN6R8; Package Size: 0805; JLCPCB Basic Part: No; JLCPCB Part Number: C519995; Supplier 1: LCSC; Category: Capacitors - MLCC; Supplier Part Number 1: C519995; Voltage Rating: 50V; Temperature Coefficient: NP0; RoHS: Yes; ComponentLink1Description: Datasheet; ComponentLink1URL: https://wmsc.lcsc.com/wmsc/upload/file/pdf/v2/lcsc/2007231534_YAGEO-CC0805BRNPO9BN6R8_C519995.pdf; ComponentLink2Description: JLCPCB Part URL; ComponentLink2URL: https://jlcpcb.com/partdetail/C519995; ComponentLink3Description: LCSC Part URL; ComponentLink3URL: https://lcsc.com/product-detail/Multilayer-Ceramic-Capacitors-MLCC---SMD-SMT_YAGEO-YAGEO-CC0805BRNPO9BN6R8_C519995.html
footprint CAP-0805 (0805 (2012M) Capacitor)
pins: 1, 2

## CC0805BRNPO9BN8R2
designator C?  Capacitance: 8.2pF  (hidden comment: *)
Capacitor, Ceramic (MLCC), 8.2pF, 50V, NP0, SMD 0805; Manufacturer: YAGEO; Manufacturer Part Number: CC0805BRNPO9BN8R2; Package Size: 0805; JLCPCB Basic Part: No; JLCPCB Part Number: C519996; Supplier 1: LCSC; Category: Capacitors - MLCC; Supplier Part Number 1: C519996; Voltage Rating: 50V; Temperature Coefficient: NP0; RoHS: Yes; ComponentLink1Description: Datasheet; ComponentLink1URL: https://wmsc.lcsc.com/wmsc/upload/file/pdf/v2/lcsc/2005181835_YAGEO-CC0805BRNPO9BN8R2_C519996.pdf; ComponentLink2Description: JLCPCB Part URL; ComponentLink2URL: https://jlcpcb.com/partdetail/C519996; ComponentLink3Description: LCSC Part URL; ComponentLink3URL: https://lcsc.com/product-detail/Multilayer-Ceramic-Capacitors-MLCC---SMD-SMT_YAGEO-YAGEO-CC0805BRNPO9BN8R2_C519996.html
footprint CAP-0805 (0805 (2012M) Capacitor)
pins: 1, 2

## CC0805BRNPO9BN9R1
designator C?  Capacitance: 9.1pF  (hidden comment: *)
Capacitor, Ceramic (MLCC), 9.1pF, 50V, NP0, SMD 0805; Manufacturer: YAGEO; Manufacturer Part Number: CC0805BRNPO9BN9R1; Package Size: 0805; JLCPCB Basic Part: No; JLCPCB Part Number: C519997; Supplier 1: LCSC; Category: Capacitors - MLCC; Supplier Part Number 1: C519997; Voltage Rating: 50V; Temperature Coefficient: NP0; RoHS: Yes; ComponentLink1Description: Datasheet; ComponentLink1URL: https://wmsc.lcsc.com/wmsc/upload/file/pdf/v2/lcsc/2007231534_YAGEO-CC0805BRNPO9BN9R1_C519997.pdf; ComponentLink2Description: JLCPCB Part URL; ComponentLink2URL: https://jlcpcb.com/partdetail/C519997; ComponentLink3Description: LCSC Part URL; ComponentLink3URL: https://lcsc.com/product-detail/Multilayer-Ceramic-Capacitors-MLCC---SMD-SMT_YAGEO-YAGEO-CC0805BRNPO9BN9R1_C519997.html
footprint CAP-0805 (0805 (2012M) Capacitor)
pins: 1, 2

## CC0805BRNPO9BNR47
designator C?  Capacitance: 0.47pF  (hidden comment: *)
Capacitor, Ceramic (MLCC), 0.47pF, 50V, NP0, SMD 0805; Manufacturer: YAGEO; Manufacturer Part Number: CC0805BRNPO9BNR47; Package Size: 0805; JLCPCB Basic Part: No; JLCPCB Part Number: C519998; Supplier 1: LCSC; Category: Capacitors - MLCC; Supplier Part Number 1: C519998; Voltage Rating: 50V; Temperature Coefficient: NP0; RoHS: Yes; ComponentLink1Description: Datasheet; ComponentLink1URL: https://wmsc.lcsc.com/wmsc/upload/file/pdf/v2/lcsc/2008031233_YAGEO-CC0805BRNPO9BNR47_C519998.pdf; ComponentLink2Description: JLCPCB Part URL; ComponentLink2URL: https://jlcpcb.com/partdetail/C519998; ComponentLink3Description: LCSC Part URL; ComponentLink3URL: https://lcsc.com/product-detail/Multilayer-Ceramic-Capacitors-MLCC---SMD-SMT_YAGEO-YAGEO-CC0805BRNPO9BNR47_C519998.html
footprint CAP-0805 (0805 (2012M) Capacitor)
pins: 1, 2

## CC0805BRNPO9BNR50
designator C?  Capacitance: 0.5pF  (hidden comment: *)
Capacitor, Ceramic (MLCC), 0.5pF, 50V, NP0, SMD 0805; Manufacturer: YAGEO; Manufacturer Part Number: CC0805BRNPO9BNR50; Package Size: 0805; JLCPCB Basic Part: No; JLCPCB Part Number: C519999; Supplier 1: LCSC; Category: Capacitors - MLCC; Supplier Part Number 1: C519999; Voltage Rating: 50V; Temperature Coefficient: NP0; RoHS: Yes; ComponentLink1Description: Datasheet; ComponentLink1URL: https://wmsc.lcsc.com/wmsc/upload/file/pdf/v2/lcsc/2008122133_YAGEO-CC0805BRNPO9BNR50_C519999.pdf; ComponentLink2Description: JLCPCB Part URL; ComponentLink2URL: https://jlcpcb.com/partdetail/C519999; ComponentLink3Description: LCSC Part URL; ComponentLink3URL: https://lcsc.com/product-detail/Multilayer-Ceramic-Capacitors-MLCC---SMD-SMT_YAGEO-YAGEO-CC0805BRNPO9BNR50_C519999.html
footprint CAP-0805 (0805 (2012M) Capacitor)
pins: 1, 2

## CC0805BRNPO9BNR68
designator C?  Capacitance: 0.68pF  (hidden comment: *)
Capacitor, Ceramic (MLCC), 0.68pF, 50V, NP0, SMD 0805; Manufacturer: YAGEO; Manufacturer Part Number: CC0805BRNPO9BNR68; Package Size: 0805; JLCPCB Basic Part: No; JLCPCB Part Number: C520000; Supplier 1: LCSC; Category: Capacitors - MLCC; Supplier Part Number 1: C520000; Voltage Rating: 50V; Temperature Coefficient: NP0; RoHS: Yes; ComponentLink1Description: Datasheet; ComponentLink1URL: https://wmsc.lcsc.com/wmsc/upload/file/pdf/v2/lcsc/2008191833_YAGEO-CC0805BRNPO9BNR68_C520000.pdf; ComponentLink2Description: JLCPCB Part URL; ComponentLink2URL: https://jlcpcb.com/partdetail/C520000; ComponentLink3Description: LCSC Part URL; ComponentLink3URL: https://lcsc.com/product-detail/Multilayer-Ceramic-Capacitors-MLCC---SMD-SMT_YAGEO-YAGEO-CC0805BRNPO9BNR68_C520000.html
footprint CAP-0805 (0805 (2012M) Capacitor)
pins: 1, 2

## CC0805BRNPO9BNR82
designator C?  Capacitance: 0.82pF  (hidden comment: *)
Capacitor, Ceramic (MLCC), 0.82pF, 50V, NP0, SMD 0805; Manufacturer: YAGEO; Manufacturer Part Number: CC0805BRNPO9BNR82; Package Size: 0805; JLCPCB Basic Part: No; JLCPCB Part Number: C520002; Supplier 1: LCSC; Category: Capacitors - MLCC; Supplier Part Number 1: C520002; Voltage Rating: 50V; Temperature Coefficient: NP0; RoHS: Yes; ComponentLink1Description: Datasheet; ComponentLink1URL: https://wmsc.lcsc.com/wmsc/upload/file/pdf/v2/lcsc/2007231534_YAGEO-CC0805BRNPO9BNR82_C520002.pdf; ComponentLink2Description: JLCPCB Part URL; ComponentLink2URL: https://jlcpcb.com/partdetail/C520002; ComponentLink3Description: LCSC Part URL; ComponentLink3URL: https://lcsc.com/product-detail/Multilayer-Ceramic-Capacitors-MLCC---SMD-SMT_YAGEO-YAGEO-CC0805BRNPO9BNR82_C520002.html
footprint CAP-0805 (0805 (2012M) Capacitor)
pins: 1, 2

## CC0805CRNPO0BN4R7
designator C?  Capacitance: 4.7pF  (hidden comment: *)
Capacitor, Ceramic (MLCC), 4.7pF, 100V, SMD 0805; Manufacturer: YAGEO; Manufacturer Part Number: CC0805CRNPO0BN4R7; Package Size: 0805; JLCPCB Basic Part: No; JLCPCB Part Number: C527074; Supplier 1: LCSC; Category: Capacitors - MLCC; Supplier Part Number 1: C527074; Voltage Rating: 100V; RoHS: Yes; ComponentLink1Description: Datasheet; ComponentLink1URL: https://wmsc.lcsc.com/wmsc/upload/file/pdf/v2/lcsc/2006241834_YAGEO-CC0805CRNPO0BN4R7_C527074.pdf; ComponentLink2Description: JLCPCB Part URL; ComponentLink2URL: https://jlcpcb.com/partdetail/C527074; ComponentLink3Description: LCSC Part URL; ComponentLink3URL: https://lcsc.com/product-detail/Multilayer-Ceramic-Capacitors-MLCC---SMD-SMT_YAGEO-YAGEO-CC0805CRNPO0BN4R7_C527074.html
footprint CAP-0805 (0805 (2012M) Capacitor)
pins: 1, 2

## CC0805CRNPO0BN5R0
designator C?  Capacitance: 5pF  (hidden comment: *)
Capacitor, Ceramic (MLCC), 5pF, 100V, NP0, SMD 0805; Manufacturer: YAGEO; Manufacturer Part Number: CC0805CRNPO0BN5R0; Package Size: 0805; JLCPCB Basic Part: No; JLCPCB Part Number: C513557; Supplier 1: LCSC; Category: Capacitors - MLCC; Supplier Part Number 1: C513557; Voltage Rating: 100V; Temperature Coefficient: NP0; RoHS: Yes; ComponentLink1Description: Datasheet; ComponentLink1URL: https://wmsc.lcsc.com/wmsc/upload/file/pdf/v2/lcsc/2005142147_YAGEO-CC0805CRNPO0BN5R0_C513557.pdf; ComponentLink2Description: JLCPCB Part URL; ComponentLink2URL: https://jlcpcb.com/partdetail/C513557; ComponentLink3Description: LCSC Part URL; ComponentLink3URL: https://lcsc.com/product-detail/Multilayer-Ceramic-Capacitors-MLCC---SMD-SMT_YAGEO-YAGEO-CC0805CRNPO0BN5R0_C513557.html
footprint CAP-0805 (0805 (2012M) Capacitor)
pins: 1, 2

## CC0805CRNPO9BN1R0
designator C?  Capacitance: 1pF  (hidden comment: *)
Capacitor, Ceramic (MLCC), 1pF, 50V, NP0, SMD 0805; Manufacturer: YAGEO; Manufacturer Part Number: CC0805CRNPO9BN1R0; Package Size: 0805; JLCPCB Basic Part: No; JLCPCB Part Number: C513668; Supplier 1: LCSC; Category: Capacitors - MLCC; Supplier Part Number 1: C513668; Voltage Rating: 50V; Temperature Coefficient: NP0; RoHS: Yes; ComponentLink1Description: Datasheet; ComponentLink1URL: https://wmsc.lcsc.com/wmsc/upload/file/pdf/v2/lcsc/2004231433_YAGEO-CC0805CRNPO9BN1R0_C513668.pdf; ComponentLink2Description: JLCPCB Part URL; ComponentLink2URL: https://jlcpcb.com/partdetail/C513668; ComponentLink3Description: LCSC Part URL; ComponentLink3URL: https://lcsc.com/product-detail/Multilayer-Ceramic-Capacitors-MLCC---SMD-SMT_YAGEO-YAGEO-CC0805CRNPO9BN1R0_C513668.html
footprint CAP-0805 (0805 (2012M) Capacitor)
pins: 1, 2

## CC0805CRNPO9BN1R2
designator C?  Capacitance: 1.2pF  (hidden comment: *)
Capacitor, Ceramic (MLCC), 1.2pF, 50V, NP0, SMD 0805; Manufacturer: YAGEO; Manufacturer Part Number: CC0805CRNPO9BN1R2; Package Size: 0805; JLCPCB Basic Part: No; JLCPCB Part Number: C327236; Supplier 1: LCSC; Category: Capacitors - MLCC; Supplier Part Number 1: C327236; Voltage Rating: 50V; Temperature Coefficient: NP0; RoHS: Yes; ComponentLink1Description: Datasheet; ComponentLink1URL: https://wmsc.lcsc.com/wmsc/upload/file/pdf/v2/lcsc/1811141242_YAGEO-CC0805CRNPO9BN1R2_C327236.pdf; ComponentLink2Description: JLCPCB Part URL; ComponentLink2URL: https://jlcpcb.com/partdetail/C327236; ComponentLink3Description: LCSC Part URL; ComponentLink3URL: https://lcsc.com/product-detail/Multilayer-Ceramic-Capacitors-MLCC---SMD-SMT_YAGEO-YAGEO-CC0805CRNPO9BN1R2_C327236.html
footprint CAP-0805 (0805 (2012M) Capacitor)
pins: 1, 2

## CC0805CRNPO9BN1R5
designator C?  Capacitance: 1.5pF  (hidden comment: *)
Capacitor, Ceramic (MLCC), 1.5pF, 50V, NP0, SMD 0805; Manufacturer: YAGEO; Manufacturer Part Number: CC0805CRNPO9BN1R5; Package Size: 0805; JLCPCB Basic Part: No; JLCPCB Part Number: C519931; Supplier 1: LCSC; Category: Capacitors - MLCC; Supplier Part Number 1: C519931; Voltage Rating: 50V; Temperature Coefficient: NP0; RoHS: Yes; ComponentLink1Description: Datasheet; ComponentLink1URL: https://wmsc.lcsc.com/wmsc/upload/file/pdf/v2/lcsc/2005141203_YAGEO-CC0805CRNPO9BN1R5_C519931.pdf; ComponentLink2Description: JLCPCB Part URL; ComponentLink2URL: https://jlcpcb.com/partdetail/C519931; ComponentLink3Description: LCSC Part URL; ComponentLink3URL: https://lcsc.com/product-detail/Multilayer-Ceramic-Capacitors-MLCC---SMD-SMT_YAGEO-YAGEO-CC0805CRNPO9BN1R5_C519931.html
footprint CAP-0805 (0805 (2012M) Capacitor)
pins: 1, 2

## CC0805CRNPO9BN1R8
designator C?  Capacitance: 1.8pF  (hidden comment: *)
Capacitor, Ceramic (MLCC), 1.8pF, 50V, NP0, SMD 0805; Manufacturer: YAGEO; Manufacturer Part Number: CC0805CRNPO9BN1R8; Package Size: 0805; JLCPCB Basic Part: No; JLCPCB Part Number: C327235; Supplier 1: LCSC; Category: Capacitors - MLCC; Supplier Part Number 1: C327235; Voltage Rating: 50V; Temperature Coefficient: NP0; RoHS: Yes; ComponentLink1Description: Datasheet; ComponentLink1URL: https://wmsc.lcsc.com/wmsc/upload/file/pdf/v2/lcsc/1811141233_YAGEO-CC0805CRNPO9BN1R8_C327235.pdf; ComponentLink2Description: JLCPCB Part URL; ComponentLink2URL: https://jlcpcb.com/partdetail/C327235; ComponentLink3Description: LCSC Part URL; ComponentLink3URL: https://lcsc.com/product-detail/Multilayer-Ceramic-Capacitors-MLCC---SMD-SMT_YAGEO-YAGEO-CC0805CRNPO9BN1R8_C327235.html
footprint CAP-0805 (0805 (2012M) Capacitor)
pins: 1, 2

## CC0805CRNPO9BN2R0
designator C?  Capacitance: 2pF  (hidden comment: *)
Capacitor, Ceramic (MLCC), 2pF, 50V, NP0, SMD 0805; Manufacturer: YAGEO; Manufacturer Part Number: CC0805CRNPO9BN2R0; Package Size: 0805; JLCPCB Basic Part: No; JLCPCB Part Number: C519932; Supplier 1: LCSC; Category: Capacitors - MLCC; Supplier Part Number 1: C519932; Voltage Rating: 50V; Temperature Coefficient: NP0; RoHS: Yes; ComponentLink1Description: Datasheet; ComponentLink1URL: https://wmsc.lcsc.com/wmsc/upload/file/pdf/v2/lcsc/2005141203_YAGEO-CC0805CRNPO9BN2R0_C519932.pdf; ComponentLink2Description: JLCPCB Part URL; ComponentLink2URL: https://jlcpcb.com/partdetail/C519932; ComponentLink3Description: LCSC Part URL; ComponentLink3URL: https://lcsc.com/product-detail/Multilayer-Ceramic-Capacitors-MLCC---SMD-SMT_YAGEO-YAGEO-CC0805CRNPO9BN2R0_C519932.html
footprint CAP-0805 (0805 (2012M) Capacitor)
pins: 1, 2

## CC0805CRNPO9BN2R2
designator C?  Capacitance: 2.2pF  (hidden comment: *)
Capacitor, Ceramic (MLCC), 2.2pF, 50V, NP0, SMD 0805; Manufacturer: YAGEO; Manufacturer Part Number: CC0805CRNPO9BN2R2; Package Size: 0805; JLCPCB Basic Part: No; JLCPCB Part Number: C519933; Supplier 1: LCSC; Category: Capacitors - MLCC; Supplier Part Number 1: C519933; Voltage Rating: 50V; Temperature Coefficient: NP0; RoHS: Yes; ComponentLink1Description: Datasheet; ComponentLink1URL: https://wmsc.lcsc.com/wmsc/upload/file/pdf/v2/lcsc/2006011835_YAGEO-CC0805CRNPO9BN2R2_C519933.pdf; ComponentLink2Description: JLCPCB Part URL; ComponentLink2URL: https://jlcpcb.com/partdetail/C519933; ComponentLink3Description: LCSC Part URL; ComponentLink3URL: https://lcsc.com/product-detail/Multilayer-Ceramic-Capacitors-MLCC---SMD-SMT_YAGEO-YAGEO-CC0805CRNPO9BN2R2_C519933.html
footprint CAP-0805 (0805 (2012M) Capacitor)
pins: 1, 2

## CC0805CRNPO9BN2R4
designator C?  Capacitance: 2.4pF  (hidden comment: *)
Capacitor, Ceramic (MLCC), 2.4pF, 50V, NP0, SMD 0805; Manufacturer: YAGEO; Manufacturer Part Number: CC0805CRNPO9BN2R4; Package Size: 0805; JLCPCB Basic Part: No; JLCPCB Part Number: C519934; Supplier 1: LCSC; Category: Capacitors - MLCC; Supplier Part Number 1: C519934; Voltage Rating: 50V; Temperature Coefficient: NP0; RoHS: Yes; ComponentLink1Description: Datasheet; ComponentLink1URL: https://wmsc.lcsc.com/wmsc/upload/file/pdf/v2/lcsc/2007161234_YAGEO-CC0805CRNPO9BN2R4_C519934.pdf; ComponentLink2Description: JLCPCB Part URL; ComponentLink2URL: https://jlcpcb.com/partdetail/C519934; ComponentLink3Description: LCSC Part URL; ComponentLink3URL: https://lcsc.com/product-detail/Multilayer-Ceramic-Capacitors-MLCC---SMD-SMT_YAGEO-YAGEO-CC0805CRNPO9BN2R4_C519934.html
footprint CAP-0805 (0805 (2012M) Capacitor)
pins: 1, 2

## CC0805CRNPO9BN2R5
designator C?  Capacitance: 2.5pF  (hidden comment: *)
Capacitor, Ceramic (MLCC), 2.5pF, 50V, NP0, SMD 0805; Manufacturer: YAGEO; Manufacturer Part Number: CC0805CRNPO9BN2R5; Package Size: 0805; JLCPCB Basic Part: No; JLCPCB Part Number: C519935; Supplier 1: LCSC; Category: Capacitors - MLCC; Supplier Part Number 1: C519935; Voltage Rating: 50V; Temperature Coefficient: NP0; RoHS: Yes; ComponentLink1Description: Datasheet; ComponentLink1URL: https://wmsc.lcsc.com/wmsc/upload/file/pdf/v2/lcsc/2006011835_YAGEO-CC0805CRNPO9BN2R5_C519935.pdf; ComponentLink2Description: JLCPCB Part URL; ComponentLink2URL: https://jlcpcb.com/partdetail/C519935; ComponentLink3Description: LCSC Part URL; ComponentLink3URL: https://lcsc.com/product-detail/Multilayer-Ceramic-Capacitors-MLCC---SMD-SMT_YAGEO-YAGEO-CC0805CRNPO9BN2R5_C519935.html
footprint CAP-0805 (0805 (2012M) Capacitor)
pins: 1, 2

## CC0805CRNPO9BN2R7
designator C?  Capacitance: 2.7pF  (hidden comment: *)
Capacitor, Ceramic (MLCC), 2.7pF, 50V, NP0, SMD 0805; Manufacturer: YAGEO; Manufacturer Part Number: CC0805CRNPO9BN2R7; Package Size: 0805; JLCPCB Basic Part: No; JLCPCB Part Number: C519936; Supplier 1: LCSC; Category: Capacitors - MLCC; Supplier Part Number 1: C519936; Voltage Rating: 50V; Temperature Coefficient: NP0; RoHS: Yes; ComponentLink1Description: Datasheet; ComponentLink1URL: https://wmsc.lcsc.com/wmsc/upload/file/pdf/v2/lcsc/2006011835_YAGEO-CC0805CRNPO9BN2R7_C519936.pdf; ComponentLink2Description: JLCPCB Part URL; ComponentLink2URL: https://jlcpcb.com/partdetail/C519936; ComponentLink3Description: LCSC Part URL; ComponentLink3URL: https://lcsc.com/product-detail/Multilayer-Ceramic-Capacitors-MLCC---SMD-SMT_YAGEO-YAGEO-CC0805CRNPO9BN2R7_C519936.html
footprint CAP-0805 (0805 (2012M) Capacitor)
pins: 1, 2

## CC0805CRNPO9BN3R0
designator C?  Capacitance: 3pF  (hidden comment: *)
Capacitor, Ceramic (MLCC), 3pF, 50V, NP0, SMD 0805; Manufacturer: YAGEO; Manufacturer Part Number: CC0805CRNPO9BN3R0; Package Size: 0805; JLCPCB Basic Part: No; JLCPCB Part Number: C519937; Supplier 1: LCSC; Category: Capacitors - MLCC; Supplier Part Number 1: C519937; Voltage Rating: 50V; Temperature Coefficient: NP0; RoHS: Yes; ComponentLink1Description: Datasheet; ComponentLink1URL: https://wmsc.lcsc.com/wmsc/upload/file/pdf/v2/lcsc/2005141203_YAGEO-CC0805CRNPO9BN3R0_C519937.pdf; ComponentLink2Description: JLCPCB Part URL; ComponentLink2URL: https://jlcpcb.com/partdetail/C519937; ComponentLink3Description: LCSC Part URL; ComponentLink3URL: https://lcsc.com/product-detail/Multilayer-Ceramic-Capacitors-MLCC---SMD-SMT_YAGEO-YAGEO-CC0805CRNPO9BN3R0_C519937.html
footprint CAP-0805 (0805 (2012M) Capacitor)
pins: 1, 2
